# Altium footprint library PBL - THD Packages.PcbLib: 137 footprints (part 3 of 9)
Each footprint in its own frame and in the unit in brackets; x right, y up, seen from the top. Pads: shape width x height; smd on the part's side, far side on the other; paste and mask are expansions set on the pad; w line width, h text height; cw(c..) or ccw(c..) is an arc to the next point about the centre after c.
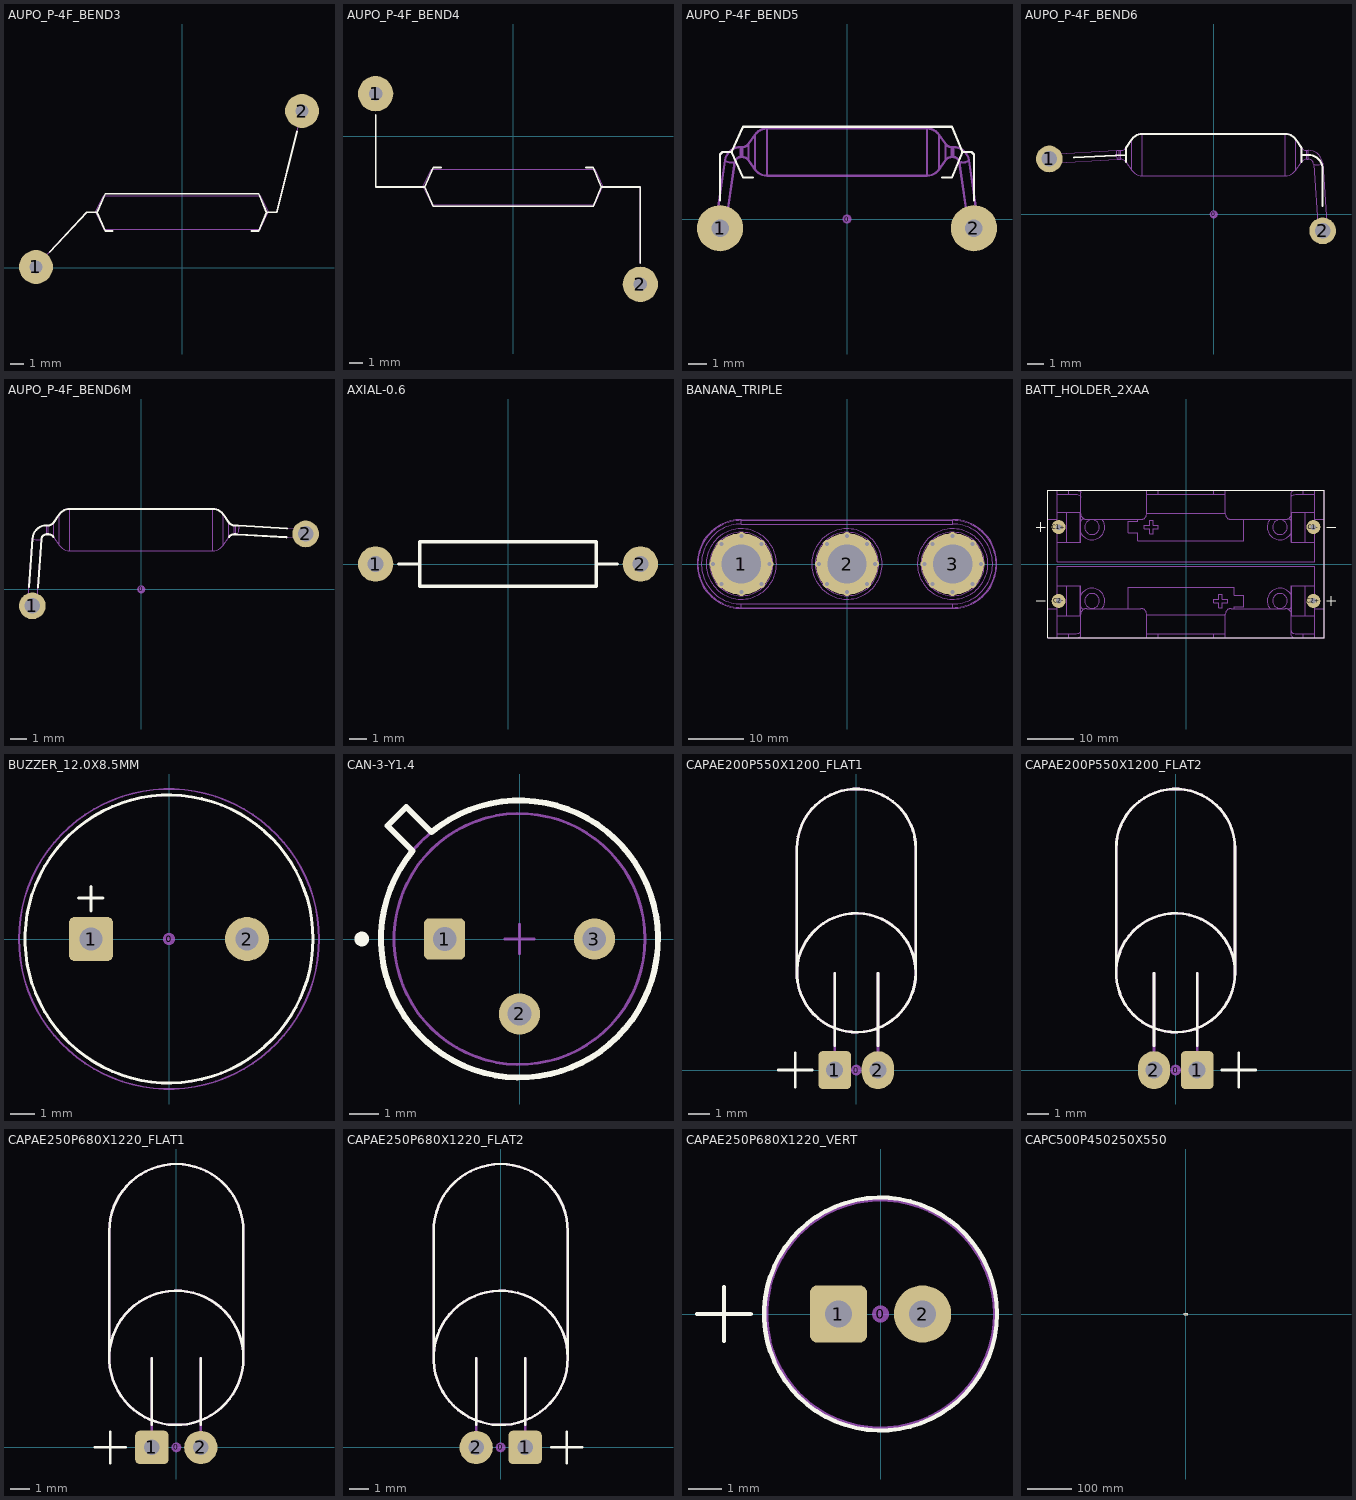
[diagram p2: the footprints below, top view; thin cyan lines are the x and y axes]

## AUPO_P-4F_BEND3 [mil] "Aupo P-4F TCO for positioning on IC legs"
height 100
pads (2):
  round 100 hole 38: 1(-431,3) 2(354,463)
Top Overlay:
  lines w5: -389.97,47.04 -281,164 -251,164 ; -205,109 -226.33,109 -251,164 ; 205,109 226.41,109 249,164 ; 338.95,403.01 279,164 249,164 ; -251,164 -226.38,219 226.38,219 249,164
13 - 3D:
  lines w3: -431,3 -280.63,164.37 -256,164.37 -231.3,213.8 231.3,213.8 254,164.37 278.63,164.37 354,463 ; -256,163.9 -231.3,114 231.3,114 254,163.9
3D body "TCOBend3.stp": height 105.02, standoff -94.88, extent -440.35,-6.96 364.65,473.01

## AUPO_P-4F_BEND4 [mil] "Aupo P-4F TCO for positioning on IC legs"
height 100
pads (2):
  round 100 hole 38: 1(-390,120) 2(360,-420)
Top Overlay:
  lines w5: -390,60 -390,-144 -251,-144 ; -226.38,-199 226.38,-199 249,-144 ; -226.38,-89 -251,-144 ; -226.33,-199 -251,-144 ; -226.33,-89 -205,-89 ; 205,-89 226.41,-89 249,-144 ; 360,-360 360,-144 249,-144
13 - 3D:
  lines w3: -390,60 -390,-144 -256,-144 ; -256,-144.1 -231.3,-194 231.3,-194 254,-144.1 ; -256,-143.63 -231.3,-94.2 231.3,-94.2 254,-143.63 ; 254,-144 360,-144 360,-360
3D body "TCOBend4.stp": height 105.02, standoff -94.88, extent -399.95,-430.6 369.97,129.36

## AUPO_P-4F_BEND5 [mil] "Aupo P-4F TCO for positioning on IC legs"
height 100
pads (3):
  round 19.68 on Mech14: 0(0,0)
  round 100 hole 38: 1(-275,-20) 2(275,-20)
Top Overlay:
  lines w5: -275,40 -275,140 -270,145 -250,145 ; -204,90 -225.33,90 -250,145 ; 206,90 227.41,90 250,145 ; 275,40 275,140 270,145 250,145 ; -250,145 -225.38,200 227.38,200 250,145
13 - 3D:
  lines w5: -282.92,0.59 ccw(c-269.19,19.56) -261.5,-2.55 ; 261.5,-2.55 ccw(c268.97,22.97) 282.85,0.28 282.92,0.59 ; -264.41,126.68 ccw(c-250.67,145.69) -242.98,123.53 ; -264.41,126.68 cw(c-230.49,121.52) -230.32,155.83 ; -264.41,126.68 -285.71,-18.43 ccw(c-275,-20) -264.29,-21.57 -242.98,123.54 ; -242.98,123.54 cw(c-230.48,121.51) -230.32,134.17 ; -230.32,134.17 -230.32,155.83 ; -230.32,134.17 -226.38,134.17 ; -230.32,155.83 -226.38,155.83 ; -226.38,134.17 cw(c-226.38,118.43) -213.48,127.46 ; -226.38,134.17 -226.38,155.83 ; -226.38,155.83 ccw(c-226.38,171.57) -213.48,162.54 ; -213.48,127.46 -213.48,162.54 ; -213.48,127.46 -199.33,107.25 ; -213.48,162.54 -199.33,182.75 ; -199.33,107.25 ccw(c-173.53,125.31) -173.53,93.82 ; -199.33,107.25 -199.33,182.75 ; -199.33,182.75 cw(c-173.53,164.69) -173.53,196.18 ; -173.53,93.82 -173.53,196.18 ; -173.53,93.82 173.53,93.82 ; -173.53,196.18 173.53,196.18 ; 173.53,93.82 ccw(c173.53,125.31) 199.33,107.25 ; 173.53,93.82 173.53,196.18 ; 173.53,196.18 cw(c173.53,164.69) 199.33,182.75 ; 199.33,107.25 199.33,182.75 ; 199.33,107.25 213.48,127.46 ; 199.33,182.75 213.48,162.54 ; 213.48,127.46 cw(c226.38,118.43) 226.38,134.17 ; 213.48,127.46 213.48,162.54 ; 213.48,162.54 ccw(c226.38,171.57) 226.38,155.83 ; 226.38,134.17 226.38,155.83 ; 226.38,134.17 230.32,134.17 ; 226.38,155.83 230.32,155.83 ; 230.32,134.17 cw(c230.48,121.51) 242.98,123.54 ; 230.32,134.17 230.32,155.83 ; 230.32,155.83 cw(c230.49,121.51) 264.41,126.68 ; 242.98,123.54 ccw(c250.45,149.1) 264.34,126.38 264.41,126.68 ; 242.98,123.54 264.29,-21.57 ccw(c275,-20) 285.83,-20 285.71,-18.43 264.41,126.68
3D body "AUPO P-F Series TCO Bend5.STEP": height 102.36, standoff -100, extent -285.73,-30.8 285.83,196.09

## AUPO_P-4F_BEND6 [mil] "Aupo P-4F TCO for positioning on IC legs"
height 100
pads (3):
  round 19.68 on Mech14: 0(0,0)
  round 65 / inner round 65 / far side round 90 hole 38: 1(-400,135) 2(265,-40)
Top Overlay:
  lines w5: -340.17,138.21 -213.48,145 ; -213.48,127.46 -213.48,162.54 -199.33,182.75 cw(c-173.53,164.69) -173.53,196.18 173.53,196.18 cw(c173.53,164.69) 199.33,182.75 213.48,162.54 213.48,127.46 ; 213.48,145 230,145 cw(c230,110) 265,110 265,20
13 - 3D:
  lines w1.97: -381.43,146.96 ccw(c-359.97,137.39) -380.14,125.34 ; 252.86,-21.08 ccw(c262.11,4.31) 274.45,-19.73 274.46,-19.61 ; -235.55,155.67 ccw(c-214.1,146.11) -234.26,134.06 ; -235.55,155.67 -400.65,145.81 ccw(c-400,135) -399.35,124.19 -234.26,134.06 ; -235.55,155.67 -232.3,155.8 -230.32,155.83 ; -234.26,134.06 -232.78,134.13 -230.32,134.17 ; -230.32,134.17 -230.32,155.83 ; -230.32,134.17 -226.38,134.17 ; -230.32,155.83 -226.38,155.83 ; -226.38,134.17 cw(c-226.38,118.43) -213.48,127.46 ; -226.38,134.17 -226.38,155.83 ; -226.38,155.83 ccw(c-226.38,171.57) -213.48,162.54 ; -213.48,127.46 -199.33,107.25 ; -213.48,127.46 -213.48,162.54 ; -213.48,162.54 -199.33,182.75 ; -199.33,107.25 ccw(c-173.53,125.31) -173.53,93.82 ; -199.33,107.25 -199.33,182.75 ; -199.33,182.75 cw(c-173.53,164.69) -173.53,196.18 ; -173.53,93.82 -173.53,196.18 ; -173.53,93.82 173.53,93.82 ; -173.53,196.18 173.53,196.18 ; 173.53,93.82 ccw(c173.53,125.31) 199.33,107.25 ; 173.53,93.82 173.53,196.18 ; 173.53,196.18 cw(c173.53,164.69) 199.33,182.75 ; 199.33,107.25 199.33,182.75 ; 199.33,107.25 213.48,127.46 ; 199.33,182.75 213.48,162.54 ; 213.48,127.46 cw(c226.38,118.43) 226.38,134.17 ; 213.48,127.46 213.48,162.54 ; 213.48,162.54 ccw(c226.38,171.57) 226.38,155.83 ; 226.38,134.17 226.38,155.83 ; 226.38,134.17 230.32,134.17 ; 226.38,155.83 230.32,155.83 ; 230.32,134.17 cw(c230.47,121.52) 243.08,122.53 ; 230.32,134.17 230.32,155.83 ; 230.32,155.83 cw(c230.46,121.51) 264.69,124 ; 243.08,122.53 ccw(c252.33,147.93) 264.67,123.88 264.69,124 ; 243.08,122.53 254.2,-40.74 ccw(c265,-40) 275.83,-40 275.8,-39.26 264.69,124
3D body "TH pad - 20 pin x 90.STEP": height 40, standoff 0, extent -445,90.09 -355.36,179.91
3D body "AUPO P-F Series TCO Bend6.STEP": height 102.87, standoff -99.49, extent -410.74,-50.8 275.83,196.09
3D body "TH pad - 20 pin x 90.STEP": height 40, standoff 0, extent 219.99,-84.91 309.64,4.91

## AUPO_P-4F_BEND6M [mil] "Aupo P-4F TCO for positioning on IC legs"
height 100
pads (3):
  round 19.68 on Mech14: 0(0,0)
  round 65 / inner round 65 / far side round 90 hole 38: 1(-265,-40) 2(400,135)
Top Overlay:
  lines w5: -272.66,6.54 -264.69,124.01 cw(c-230.48,121.53) -230.32,155.83 -226.38,155.83 ccw(c-226.38,171.57) -213.48,162.54 -199.33,182.75 cw(c-173.53,164.69) -173.53,196.18 173.53,196.18 cw(c173.53,164.69) 199.33,182.75 213.48,162.54 ccw(c226.38,171.57) 226.38,155.83 230.32,155.83 233.67,155.76 235.64,155.67 354.91,148.54 ; -251.05,5.07 -243.08,122.54 cw(c-230.46,121.51) -230.32,134.17 -226.38,134.17 cw(c-226.38,118.43) -213.48,127.46 ; 213.48,127.46 cw(c226.38,118.43) 226.38,134.17 230.32,134.17 231.82,134.16 234.34,134.05 353.62,126.93
13 - 3D:
  lines w1.97: -274.43,-19.69 ccw(c-262.06,2.73) -252.83,-21.16 ; 380.23,125.34 ccw(c367.39,134.41) 382.95,136.67 383.02,139.06 382.98,141.3 382.83,143.28 382.58,144.91 382.25,146.1 381.85,146.78 381.52,146.95 ; -264.69,124.01 ccw(c-252.3,146.47) -243.08,122.54 ; -264.69,124.01 cw(c-230.48,121.53) -230.32,155.83 ; -264.69,124.01 -275.76,-39.27 ccw(c-264.96,-40) -254.16,-40.73 -243.08,122.54 ; -243.08,122.54 cw(c-230.46,121.51) -230.32,134.17 ; -230.32,134.17 -230.32,155.83 ; -230.32,134.17 -226.38,134.17 ; -230.32,155.83 -226.38,155.83 ; -226.38,134.17 cw(c-226.38,118.43) -213.48,127.46 ; -226.38,134.17 -226.38,155.83 ; -226.38,155.83 ccw(c-226.38,171.57) -213.48,162.54 ; -213.48,127.46 -213.48,162.54 ; -213.48,127.46 -199.33,107.25 ; -213.48,162.54 -199.33,182.75 ; -199.33,107.25 ccw(c-173.53,125.31) -173.53,93.82 ; -199.33,107.25 -199.33,182.75 ; -199.33,182.75 cw(c-173.53,164.69) -173.53,196.18 ; -173.53,93.82 -173.53,196.18 ; -173.53,93.82 173.53,93.82 ; -173.53,196.18 173.53,196.18 ; 173.53,93.82 ccw(c173.53,125.31) 199.33,107.25 ; 173.53,93.82 173.53,196.18 ; 173.53,196.18 cw(c173.53,164.69) 199.33,182.75 ; 199.33,107.25 199.33,182.75 ; 199.33,107.25 213.48,127.46 ; 199.33,182.75 213.48,162.54 ; 213.48,127.46 cw(c226.38,118.43) 226.38,134.17 ; 213.48,127.46 213.48,162.54 ; 213.48,162.54 ccw(c226.38,171.57) 226.38,155.83 ; 226.38,134.17 226.38,155.83 ; 226.38,134.17 230.32,134.17 ; 226.38,155.83 230.32,155.83 ; 230.32,134.17 230.32,155.83 ; 230.32,134.17 231.82,134.16 234.34,134.05 ; 230.32,155.83 233.67,155.76 235.64,155.67 ; 234.34,134.05 ccw(c221.51,143.13) 237.07,145.38 237.13,147.77 237.09,150.02 236.94,152 236.69,153.63 236.36,154.82 235.96,155.5 235.64,155.67 ; 234.34,134.05 399.35,124.19 ccw(c400,135) 400.65,145.81 235.64,155.67
3D body "TH pad - 20 pin x 90.STEP": height 40, standoff 0, extent -309.64,-84.91 -220,4.92
3D body "AUPO P-F Series TCO Bend6M.STEP": height 102.95, standoff -100, extent -275.7,-50.8 410.83,196.09
3D body "TH pad - 20 pin x 90.STEP": height 40, standoff 0, extent 355.36,90.1 445,179.92

## AXIAL-0.6 [mil] "Axial Device, Thru-Hole; 2 Leads; 0.6 in Pin Spacing"
height 100
pads (2):
  round 80 hole 36: 1(-300,0) 2(300,0)
Top Overlay:
  lines w7.87: -248.03,0 -200,0 ; 200,0 248.03,0 ; -200,-50 200,-50 200,50 -200,50 -200,-50
3D body "Res_Axial_0.6.STEP": height 102.76, standoff -98.43, extent -311.8,-51.57 311.82,51.58

## BANANA_TRIPLE [mil] "Triple Banana jack, panel mount style"
height 318.9
pads (3):
  round 440 hole 280: 1(-750,0) 2(0,0) 3(750,0)
via 750,200 diameter 56 hole 28
via 608.58,141.42 diameter 56 hole 28
via 550,0 diameter 56 hole 28
via 608.58,-141.42 diameter 56 hole 28
via 750,-200 diameter 56 hole 28
via 891.42,-141.42 diameter 56 hole 28
via 950,0 diameter 56 hole 28
via 891.42,141.42 diameter 56 hole 28
via -750,200 diameter 56 hole 28
via -891.42,141.42 diameter 56 hole 28
via -950,0 diameter 56 hole 28
via -891.42,-141.42 diameter 56 hole 28
via -750,-200 diameter 56 hole 28
via -608.58,-141.42 diameter 56 hole 28
via -550,0 diameter 56 hole 28
via -608.58,141.42 diameter 56 hole 28
via 141.42,141.42 diameter 56 hole 28
via 200,0 diameter 56 hole 28
via 141.42,-141.42 diameter 56 hole 28
via 0,-200 diameter 56 hole 28
via -141.42,-141.42 diameter 56 hole 28
via -200,0 diameter 56 hole 28
via -141.42,141.42 diameter 56 hole 28
via 0,200 diameter 56 hole 28
13 - 3D:
  circle w5: c750,0 r250
  circle w5: c750,0 r83
  circle w5: c750,0 r225
  circle w5: c0,0 r250
  circle w5: c-750,0 r83
  circle w5: c0,0 r83
  circle w5: c0,0 r225
  circle w5: c-750,0 r225
  circle w5: c-750,0 r250
  lines w5: -750,-315 cw(c-750,0) -750,315 ; -750,-315 750,-315 ; -750,-315 -750,-283.94 ; -750,-283.94 cw(c-750,0) -750,283.94 ; -750,-283.94 750,-283.94 ; -750,283.94 -750,315 ; -750,283.94 750,283.94 ; -750,315 750,315 ; 750,-315 ccw(c750,0) 750,315 ; 750,-315 750,-283.94 ; 750,-283.94 ccw(c750,0) 750,283.94 ; 750,283.94 750,315 ; -750,-308.9 cw(c-750,0) -750,308.9 750,308.9 cw(c750,0) 750,-308.9 -750,-308.9
3D body "Banana Jack Triple.STEP": height 380, standoff -840, extent -1064.99,-314.99 1065,315

## BATT_HOLDER_2XAA [mil] "2-cell AA battery holder"
height 660
pads (4):
  round 120 hole 48: C1+(-1086.61,314.96) C1-(1086.61,314.96) C2+(1086.61,-314.96) C2-(-1086.61,-314.96)
Top Overlay:
  lines w5: -1279.53,-314.96 -1200.79,-314.96 ; -1279.53,314.96 -1200.79,314.96 ; -1240.16,275.59 -1240.16,354.33 ; 1200.79,-314.96 1279.53,-314.96 ; 1200.79,314.96 1279.53,314.96 ; 1240.16,-354.33 1240.16,-275.59
  lines w7.87: -1181.1,-629.92 1181.1,-629.92 1181.1,629.92 -1181.1,629.92 -1181.1,-629.92
13 - 3D:
  drawing of 198 lines, arcs and shapes, not listed
3D body "2xAA Battery Holder.STEP": height 657.48, standoff -118.11, extent -1181.1,-629.91 1181.1,629.93

## BUZZER_12.0X8.5MM [mil]
height 354.33
pads (3):
  round 20 on Mech14: 0(0,0)
  rrect25% 72x72 / inner rrect25% 72x72 / far side rrect25% 90x90 hole 38: 1(-127.95,0)
  round 72 / inner round 72 / far side round 90 hole 38: 2(127.95,0)
Top Overlay:
  circle w5: c0,0 r236.22
  lines w5: -148.27,66.93 -108.27,66.93 ; -128.02,45.87 -128.02,85.87
13 - 3D:
  circle w3: c0.14,-0.47 r236.22
14 - Courtyards Top:
  circle w3: c0,0 r246.06
3D body "TH pad - 28 pin x 90.STEP": height 50, standoff 0, extent -172.59,-44.91 -82.95,44.92
3D body "TH pad - 28 pin x 90.STEP": height 50, standoff 0, extent 83.31,-44.9 172.96,44.92
3D body "3100-xxx speaker 8.5mm.STEP": height 354.33, standoff -110.24, extent -246.02,-246.04 246.07,246.06

## CAN-3-Y1.4 [mm] "Can; 3 Leads; Pin Circle Dia. 5.08 mm; Lead Dia. 0.48 mm (max)"
height 4.55
pads (3):
  rrect25% 1.4x1.4 hole 0.8: 1(-2.54,0)
  round 1.4 hole 0.8: 2(0,-2.54) 3(2.54,0)
Top Overlay:
  circle w0.25: c-5.35,0 r0.125
  lines w0.2: -3.626,2.99 -4.475,3.838 -3.838,4.475 -2.99,3.626 ; -3.622,2.987 ccw(c0,0) -2.987,3.622
13 - 3D:
  circle w0.1: c0,0 r4.695
  circle w0.1: c0,0 r4.255
14 - Courtyards Top:
  lines w0.1: -0.5,0 0.5,0 ; 0,-0.5 0,0.5
3D body: height 1.27, standoff 0, extent -4.694,-4.694 4.694,4.694
3D body: height 4.55, standoff 1.27, extent -4.254,-4.254 4.254,4.254

## CAPAE200P550X1200_FLAT1 [mil]
height 216.54
pads (3):
  round 20 on Mech14: 0(0,0)
  rrect25% 60x70 hole 31.5: 1(-40,0)
  oval 60x70 hole 31.5: 2(40,0)
Top Overlay:
  circle w5: c0,180 r110
  lines w5: -144.57,0 -81.57,0 ; -113.07,-31.5 -113.07,31.5 ; -110,180 -110,410 cw(c0,410) 110,410 110,180 ; -40,45 -40,179.21 ; 40,45 40,179.21
13 - 3D:
  circle w5: c0,180 r110
  lines w5: -110,180 -110,410 cw(c0,410) 110,410 110,180 ; -40,0 -40,179.21 ; 40,0 40,179.21
3D body "CAPAE200P550X1200_FLAT1.STEP": height 215.69, standoff -70, extent -107.37,-9.82 107.35,502.05

## CAPAE200P550X1200_FLAT2 [mil]
height 216.54
pads (3):
  round 20 on Mech14: 0(0,0)
  rrect25% 60x70 hole 31.5: 1(40,0)
  oval 60x70 hole 31.5: 2(-40,0)
Top Overlay:
  circle w5: c0,180 r110
  lines w5: -110,180 -110,410 cw(c0,410) 110,410 110,180 ; -40,45 -40,179.21 ; 40,45 40,179.21 ; 85.43,0 148.43,0 ; 116.93,-31.5 116.93,31.5
13 - 3D:
  circle w5: c0,180 r110
  lines w5: -110,180 -110,410 cw(c0,410) 110,410 110,180 ; -40,0 -40,179.21 ; 40,0 40,179.21
3D body "CAPAE200P550X1200_FLAT2.STEP": height 215.69, standoff -70, extent -107.33,-9.82 107.39,502.05

## CAPAE250P680X1220_FLAT1 [mm]
height 6.8
pads (3):
  round 0.508 on Mech14: 0(0,0)
  rrect25% 1.7x1.7 hole 0.8: 1(-1.25,0)
  round 1.7 hole 0.8: 2(1.25,0)
Top Overlay:
  circle w0.127: c0,4.572 r3.429
  lines w0.127: -4.18,0 -2.58,0 ; -3.429,4.572 -3.429,11.049 cw(c0,11.049) 3.429,11.049 3.429,4.572 ; -3.38,-0.8 -3.38,0.8 ; -1.25,1.143 -1.25,4.552 ; 1.25,1.143 1.25,4.552
13 - 3D:
  circle w0.127: c0,4.572 r3.429
  lines w0.127: -3.429,4.572 -3.429,11.049 cw(c0,11.049) 3.429,11.049 3.429,4.572 ; -1.25,0 -1.25,4.552 ; 1.25,0 1.25,4.552
3D body "CAPAE250P680X1220_FLAT1.STEP": height 6.77, standoff -1.78, extent -3.372,-0.249 3.371,12.952

## CAPAE250P680X1220_FLAT2 [mm]
height 6.8
pads (3):
  round 0.508 on Mech14: 0(0,0)
  rrect25% 1.7x1.7 hole 0.8: 1(1.25,0)
  round 1.7 hole 0.8: 2(-1.25,0)
Top Overlay:
  circle w0.127: c0,4.572 r3.429
  lines w0.127: -3.429,4.572 -3.429,11.049 cw(c0,11.049) 3.429,11.049 3.429,4.572 ; -1.25,1.143 -1.25,4.552 ; 1.25,1.143 1.25,4.552 ; 2.58,0 4.18,0 ; 3.38,-0.8 3.38,0.8
13 - 3D:
  circle w0.127: c0,4.572 r3.429
  lines w0.127: -3.429,4.572 -3.429,11.049 cw(c0,11.049) 3.429,11.049 3.429,4.572 ; -1.25,0 -1.25,4.552 ; 1.25,0 1.25,4.552
3D body "CAPAE250P680X1220_FLAT2.STEP": height 6.77, standoff -1.78, extent -3.371,-0.249 3.372,12.952

## CAPAE250P680X1220_VERT [mm]
height 12.2
pads (3):
  round 0.508 on Mech14: 0(0,0)
  rrect25% 1.7x1.7 hole 0.8: 1(-1.25,0)
  round 1.7 hole 0.8: 2(1.25,0)
Top Overlay:
  circle w0.127: c0,0 r3.459
  lines w0.127: -5.45,0 -3.85,0 ; -4.65,-0.8 -4.65,0.8
13 - 3D:
  circle w0.127: c0,0 r3.4
3D body "CAPAE250P680X1220_VERT.STEP": height 12.2, standoff -1.78, extent -3.372,-3.372 3.371,3.372

## CAPC500P450250X550 [mm] "TDK FK24 radial ceramic capacitor"
height 5.5
pads (3):
  round 0.508 on Mech14: 0(0,0)
  rrect25% 1.905x1.905 hole 0.8: 1(-2.5,0)
  round 1.905 hole 0.8: 2(2.5,0)
Top Overlay:
  lines w0.127: -3.81,-1.27 -3.81,1.27 3.81,1.27 3.81,-1.27 -3.81,-1.27
13 - 3D:
  lines w0.127: -2.5,-0.3 cw(c-2.5,0) -2.5,0.3 ; -2.25,-0.523 -2.248,-0.511 -2.24,-0.497 -2.227,-0.48 -2.21,-0.461 -2.186,-0.439 -2.157,-0.415 -2.122,-0.387 -2.083,-0.357 -2.046,-0.327 -2.006,-0.292 -1.995,-0.281 -1.983,-0.268 -1.972,-0.254 -1.962,-0.238 -1.958,-0.229 -1.955,-0.218 -1.954,-0.211 -1.953,-0.203 ; -2.25,0.523 cw(c-3.279,-0.727) -1.953,0.203 ; -2.236,-0.718 cw(c-1.896,-0.22) -2.5,-0.217 -2.5,0.217 cw(c-1.896,0.221) -2.232,0.723 -2.23,0.724 -2.206,0.741 ; -2.232,-0.723 -2.225,-0.727 -2.205,-0.742 ; 2.205,0.742 2.225,0.727 2.232,0.723 ; 2.206,-0.741 2.23,-0.724 2.232,-0.723 ccw(c1.896,-0.221) 2.5,-0.217 2.5,0.217 ccw(c1.896,0.22) 2.236,0.718 ; 2.25,-0.523 2.243,-0.502 2.225,-0.477 2.187,-0.44 2.134,-0.397 2.073,-0.349 2.007,-0.293 1.986,-0.271 1.967,-0.246 1.956,-0.223 1.953,-0.203 ; 2.25,0.523 2.24,0.497 2.21,0.461 2.157,0.415 2.083,0.357 2.046,0.327 2.006,0.292 1.983,0.268 1.962,0.238 1.955,0.218 1.953,0.203 ; 2.5,-0.3 ccw(c2.5,0) 2.5,0.3 ; -1.953,-0.203 1.953,-0.203 ; -1.953,-0.203 -1.953,0.203 ; -1.953,0.203 1.953,0.203 ; -1.8,-1.003 cw(c-1.777,-0.913) -1.867,-0.935 cw(c9.111,-1.292) -1.819,-0.203 -1.819,0.203 ccw(c-168.083,-10.401) -1.867,0.935 cw(c-1.777,0.912) -1.8,1.003 ; -1.8,-1.003 cw(c-1.8,-0.553) -2.25,-0.553 -2.25,0.553 cw(c-1.8,0.553) -1.8,1.003 ; -1.8,-1.003 1.8,-1.003 ; -1.8,1.003 1.8,1.003 ; 1.8,-1.003 ccw(c1.777,-0.912) 1.867,-0.935 cw(c168.269,10.414) 1.819,-0.203 1.819,0.203 ccw(c-9.111,1.292) 1.867,0.935 ccw(c1.777,0.913) 1.8,1.003 ; 1.8,-1.003 ccw(c1.8,-0.553) 2.25,-0.553 2.25,0.553 ccw(c1.8,0.553) 1.8,1.003 ; 1.953,-0.203 1.953,0.203
3D body "TDK FK24 ceramic capacitor.STEP": height 5.47, standoff -2.54, extent -2.797,-1.003 2.798,1.003